# Altium footprint library PcbLibLafe.PcbLib: 297 footprints (part 7 of 19)
Each footprint in its own frame and in the unit in brackets; x right, y up, seen from the top. Pads: shape width x height; smd on the part's side, far side on the other; paste and mask are expansions set on the pad; w line width, h text height; cw(c..) or ccw(c..) is an arc to the next point about the centre after c.
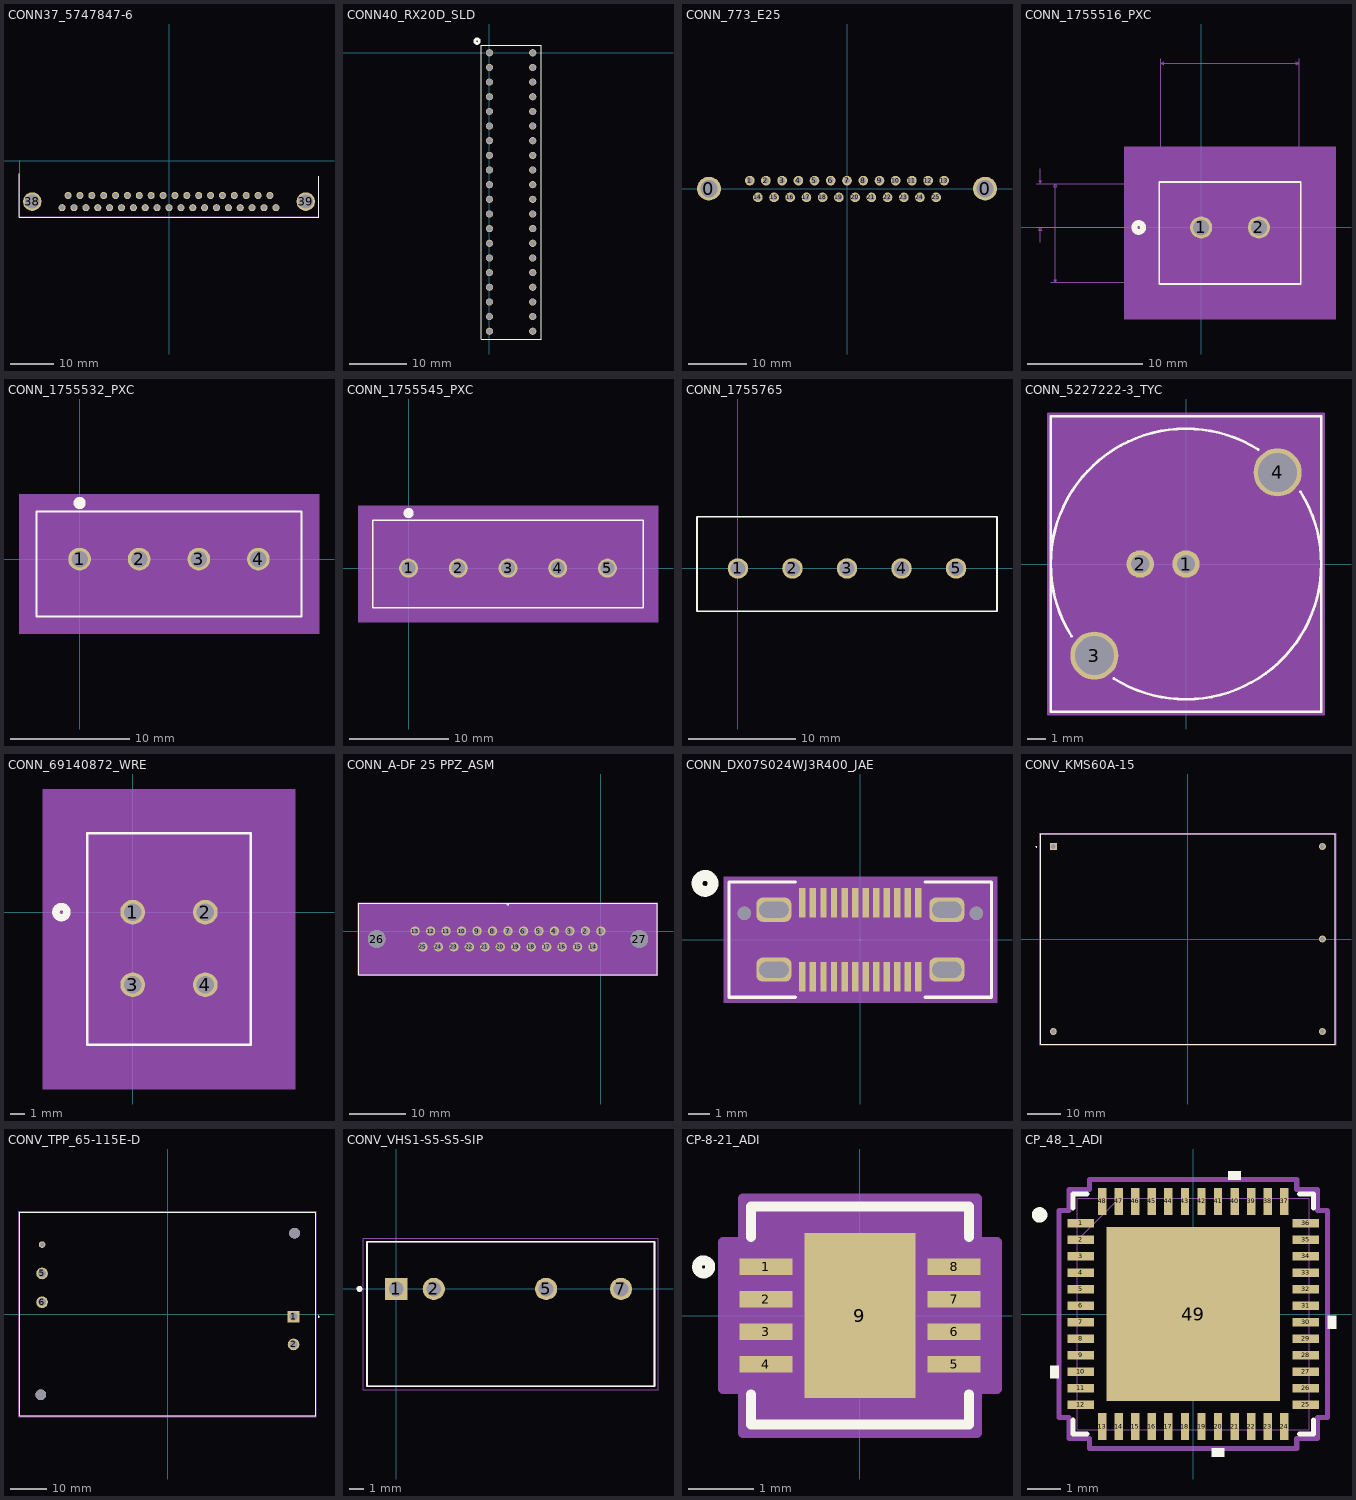
[diagram p6: the footprints below, top view; thin cyan lines are the x and y axes]

## CONN37_5747847-6 [mil] "male 37pin dsub"
pads (39):
  round 65 hole 45 mask+0: 1(-981,-430) 2(-872,-430) 3(-763,-430) 4(-654,-430) 5(-545,-430) 6(-436,-430) 7(-327,-430) 8(-218,-430) 9(-109,-430) 10(0,-430) 11(109,-430) 12(218,-430) 13(327,-430) 14(436,-430) 15(545,-430) 16(654,-430) 17(763,-430) 18(872,-430) 19(981,-430) 20(-926.5,-318) 21(-817.5,-318) 22(-708.5,-318) 23(-599.5,-318) 24(-490.5,-318) 25(-381.5,-318) 26(-272.5,-318) 27(-163.5,-318) 28(-54.5,-318) 29(54.5,-318) 30(163.5,-318) 31(272.5,-318) 32(381.5,-318) 33(490.5,-318) 34(599.5,-318) 35(708.5,-318) 36(817.5,-318) 37(926.5,-318)
  round 170 hole 130: 38(-1255,-374)
  round 170 / inner round 130 / far side round 130 hole 130: 39(1255,-374)
Top Overlay:
  lines w6: -1377,-118 -1377,-517 1377,-517 1377,-141
Mechanical 13:
  lines w1: -1372,0 -1372,-512 1372,-512
3D body: height 10, standoff 0, extent 0,0 10,10
3D body "CONN_5747847-6.step": height 509.02, standoff -125, extent -1362.01,-520 1382.01,235

## CONN40_RX20D_SLD [mil]
pads (40):
  round 49 hole 39 mask+0: 1(0,0) 2(0,-100) 3(0,-200) 4(0,-300) 5(0,-400) 6(0,-500) 7(0,-600) 8(0,-700) 9(0,-800) 10(0,-900) 11(0,-1000) 12(0,-1100) 13(0,-1200) 14(0,-1300) 15(0,-1400) 16(0,-1500) 17(0,-1600) 18(0,-1700) 19(0,-1800) 20(0,-1900) 21(295.28,-1900) 22(295.28,-1800) 23(295.28,-1700) 24(295.28,-1600) 25(295.28,-1500) 26(295.28,-1400) 27(295.28,-1300) 28(295.28,-1200) 29(295.28,-1100) 30(295.28,-1000) 31(295.28,-900) 32(295.28,-800) 33(295.28,-700) 34(295.28,-600) 35(295.28,-500) 36(295.28,-400) 37(295.28,-300) 38(295.28,-200) 39(295.28,-100) 40(295.28,0)
Top Overlay:
  circle w20: c-84.36,79 r15
  lines w6: -57.36,-1953 -57.36,53 352.64,53 352.64,-1953 -57.36,-1953
Bottom Overlay:
  circle w20: c-84.36,79 r15
3D body: height 10, standoff 0, extent 0,0 10,10

## CONN_773_E25 [mil] "25 pin maie right angle"
pads (27):
  round 160 hole 115: 0(-926,0) 0(926,0)
  round 65 hole 40: 1(-652,54) 2(-544,54) 3(-435,54) 4(-326,54) 5(-218,54) 6(-109,54) 7(0,54) 8(109,54) 9(218,54) 10(326,54) 11(435,54) 12(544,54) 13(652,54) 14(-598,-58) 15(-489,-58) 16(-381,-58) 17(-272,-58) 18(-163,-58) 19(-55,-58) 20(55,-58) 21(163,-58) 22(272,-58) 23(381,-58) 24(489,-58) 25(598,-58)
3D body "773-E25-113.STEP": height 496, standoff -124.5, extent -1043,-611.25 1044,67.25

## CONN_1755516_PXC [mil]
pads (2):
  round 75 hole 55 mask+0: 1(0,0) 2(196.85,0)
Top Overlay:
  circle w20: c-212.57,0 r15
  lines w6: -142.57,-192.39 339.43,-192.39 339.43,154.61 -142.57,154.61 -142.57,-192.39
Bottom Overlay:
  circle w20: c-212.57,0 r15
Mechanical 5:
  region: -262.57,274.61 459.43,274.61 459.43,-312.39 -262.57,-312.39
Mechanical 7:
  lines w1: -562.57,0 98.43,0 ; -562.57,149.61 -137.57,149.61 ; -547.57,-50 -547.57,0 ; -547.57,199.61 -547.57,149.61 ; -512.57,-187.39 -137.57,-187.39 ; -512.57,149.61 -137.57,149.61 ; -137.57,574.61 -137.57,149.61 ; 0,249.61 0,0 ; 196.85,0 196.85,249.61 ; 334.43,149.61 334.43,574.61 ; 434.43,-50 434.43,0 ; 434.43,50 434.43,0 ; -547.57,0 -552.57,-10 -542.57,-10 -547.57,0 ; -547.57,149.61 -552.57,159.61 -542.57,159.61 -547.57,149.61 ; -497.57,-187.39 -497.57,149.61 ; -497.57,-187.39 -502.57,-177.39 -492.57,-177.39 -497.57,-187.39 ; -497.57,149.61 -502.57,139.61 -492.57,139.61 -497.57,149.61 ; -137.57,559.61 334.43,559.61 ; -137.57,559.61 -127.57,564.61 -127.57,554.61 -137.57,559.61 ; 0,0 449.43,0 0,0 ; 0,234.61 196.85,234.61 ; 0,234.61 10,239.61 10,229.61 0,234.61 ; 196.85,234.61 186.85,239.61 186.85,229.61 196.85,234.61 ; 334.43,559.61 324.43,564.61 324.43,554.61 334.43,559.61 ; 434.43,0 429.43,10 439.43,10 434.43,0 ; 434.43,0 429.43,-10 439.43,-10 434.43,0
  text "Default Padstyle: EX75Y75D55P" at -264.07,-347.39 h50
  text "1st Mtg Padstyle: RX80Y120D50P" at -276.57,-422.39 h50
  text "2nd Mtg Padstyle: EX70Y70D70P" at -264.07,-497.39 h50
  text "3rd Mtg Padstyle: EX70Y70D70P" at -264.07,-572.39 h50
  text "Left Mtg Padstyle: EX60Y60D30P" at -276.57,-647.39 h50
  text "Right Mtg Padstyle: EX60Y60D30P" at -289.07,-722.39 h50
  text "Alt Padstyle 1: OX60Y90D30P" at -239.07,-797.39 h50
  text "Alt Padstyle 2: OX90Y60D30P" at -239.07,-872.39 h50
  text "0.197in/5mm" at -117.96,254.61 h25
  text "0.472in/11.989mm" at -1.57,579.61 h25
  text "0in/0mm" at 454.43,-12.5 h25
  text "0.15in/3.8mm" at -717.57,62.3 h25
  text "0.337in/8.56mm" at -692.57,-31.39 h25
Mechanical 13:
  circle w20: c0,75 r15
  lines w1: -137.57,-187.39 334.43,-187.39 334.43,149.61 -137.57,149.61 -137.57,-187.39
Mechanical 15:
  region: 344.43,159.61 -147.57,159.61 -147.57,-197.39 344.43,-197.39
  lines w6: -147.57,-197.39 -147.57,159.61 344.43,159.61 344.43,-197.39 -147.57,-197.39
3D body: height 10, standoff 0, extent 0,0 10,10

## CONN_1755532_PXC [mil]
pads (4):
  round 75 hole 55 mask+0: 1(0,0) 2(196.85,0) 3(393.7,0) 4(590.55,0)
Top Overlay:
  circle w20: c0,185.36 r10
  lines w6: -142.72,-189.64 -142.72,157.36 733.28,157.36 733.28,-189.64 -142.72,-189.64
Mechanical 5:
  region: 790.78,-247.14 -200.22,-247.14 -200.22,214.86 790.78,214.86
Mechanical 7:
  lines w1: 0,-244.64 0,-63.64 ; 50,-234.64 0,-234.64 ; 540.55,-234.64 590.55,-234.64 ; 590.55,-244.64 590.55,-63.64 ; 0,-234.64 10,-229.64 10,-239.64 0,-234.64 ; 590.55,-234.64 580.55,-229.64 580.55,-239.64 590.55,-234.64 ; 778.28,-16.14 783.28,-6.14 773.28,-6.14 778.28,-16.14 ; 778.28,-16.14 783.28,-26.14 773.28,-26.14 778.28,-16.14 ; 638.05,-16.14 788.28,-16.14 638.05,-16.14
  text ".5905512in/15mm (4 @ .1968504in/5mm)" at 70.28,-259.64 h25
  text "Alt 2 Padstyle: OX90Y60D30P" at -42.22,-684.64 h50
  text "Alt 1 Padstyle: OX60Y90D30P" at -42.22,-584.64 h50
  text "Pin 1 Padstyle: EX75Y75D55P" at -42.22,-484.64 h50
  text "Default Padstyle: OX75Y75D55P" at -67.22,-384.64 h50
Mechanical 13:
  circle w0: c0,137.36 r10
  lines w1: -137.72,-184.64 -137.72,152.36 728.28,152.36 728.28,-184.64 -137.72,-184.64
Mechanical 15:
  region: 738.28,162.36 -147.72,162.36 -147.72,-194.64 738.28,-194.64
  lines w6: -147.72,-194.64 738.28,-194.64 738.28,162.36 -147.72,162.36 -147.72,-194.64
3D body "1755532_04.stp": height 472.44, standoff -153.54, extent -116.14,-169.29 750,169.29
3D body: height 10, standoff 0, extent 0,0 10,10

## CONN_1755545_PXC [mil] "5 position 5mm pitch"
pads (5):
  round 75 hole 55 mask+0: 1(0,0) 2(196.85,0) 3(393.7,0) 4(590.55,0) 5(787.4,0)
Top Overlay:
  circle w20: c0,217.84 r10
  lines w6: -142.8,-157.16 -142.8,189.84 930.2,189.84 930.2,-157.16 -142.8,-157.16
Mechanical 5:
  region: 987.7,-214.66 -200.3,-214.66 -200.3,247.34 987.7,247.34
Mechanical 7:
  lines w1: -142.8,-172.9 -142.8,0 ; 0,-212.16 0,-31.16 ; 0,-172.9 0,0 ; 50,-202.16 0,-202.16 ; 737.4,-202.16 787.4,-202.16 ; 787.4,-212.16 787.4,-31.16 ; -142.8,-157.9 -132.8,-162.9 -132.8,-152.91 -142.8,-157.9 ; -142.8,-157.9 0,-157.9 ; 0,-202.16 10,-197.16 10,-207.16 0,-202.16 ; 0,-157.9 -10,-152.91 -10,-162.9 0,-157.9 ; 787.4,-202.16 777.4,-197.16 777.4,-207.16 787.4,-202.16 ; 975.2,16.34 980.2,26.34 970.2,26.34 975.2,16.34 ; 975.2,16.34 980.2,6.34 970.2,6.34 975.2,16.34 ; 834.9,16.34 985.2,16.34 834.9,16.34
  text "0.143in/3.627mm" at -165.15,-202.9 h25
  text ".7874016in/20mm (5 @ .1968504in/5mm)" at 168.7,-227.16 h25
  text "Alt 2 Padstyle: OX90Y60D30P" at 56.2,-652.16 h50
  text "Alt 1 Padstyle: OX60Y90D30P" at 56.2,-552.16 h50
  text "Pin 1 Padstyle: EX75Y75D55P" at 56.2,-452.16 h50
  text "Default Padstyle: OX75Y75D55P" at 31.2,-352.16 h50
Mechanical 13:
  circle w0: c0,169.84 r10
  lines w1: -137.8,-152.16 -137.8,184.84 925.2,184.84 925.2,-152.16 -137.8,-152.16
Mechanical 15:
  region: 935.2,194.84 -147.8,194.84 -147.8,-162.16 935.2,-162.16
  lines w6: -147.8,-162.16 935.2,-162.16 935.2,194.84 -147.8,194.84 -147.8,-162.16
3D body "1755545_04.stp": height 472.44, standoff -153.54, extent -112.99,-169.29 950,169.29
3D body: height 10, standoff 0, extent 0,0 10,10

## CONN_1755765 [mil] "5 position 200 mil"
pads (5):
  round 75 hole 55 mask+0: 1(0,0) 2(200,0) 3(400,0) 4(600,0) 5(800,0)
Top Overlay:
  lines w6: -150,-157.16 -150,189.84 950,189.84 950,-157.16 -150,-157.16
3D body: height 10, standoff 0, extent 0,0 10,10

## CONN_5227222-3_TYC [mil]
pads (4):
  round 60 hole 40 paste-99999 mask+0: 1(0,0) 2(-100,0)
  round 105 / inner round 60 / far side round 105 hole 85 paste-99999 mask+0: 3(-200,-200) 4(200,200)
Top Overlay:
  lines w6: -250,-157.54 cw(c0,0) 157.54,250 ; -157.54,-250 ccw(c0,0) 295.5,0 ccw(c0,0) 250,157.54 ; -295.5,-322.5 295.5,-322.5 295.5,322.5 -295.5,322.5 -295.5,-322.5
Mechanical 13:
  circle w0: c0,0 r290.5
  lines w1: -290.5,-317.5 290.5,-317.5 290.5,317.5 -290.5,317.5 -290.5,-317.5
Mechanical 15:
  region: 300.5,-327.5 -300.5,-327.5 -300.5,327.5 300.5,327.5
  lines w6: -300.5,-327.5 300.5,-327.5 300.5,327.5 -300.5,327.5 -300.5,-327.5
3D body "c-5227222-3-c-3d.stp": height 1400, standoff -225, extent -300.5,-293 280.5,332

## CONN_69140872_WRE [mil]
pads (4):
  round 67 hole 47 mask+0: 1(0,0) 2(196.85,0) 3(0,-196.85) 4(196.85,-196.85)
Top Overlay:
  circle w20: c-193.07,0 r15
  lines w6: -123.07,-359.33 319.93,-359.33 319.93,213.67 -123.07,213.67 -123.07,-359.33
Bottom Overlay:
  circle w20: c-193.07,0 r15
Mechanical 5:
  region: -243.07,333.67 439.93,333.67 439.93,-479.33 -243.07,-479.33
Mechanical 13:
  circle w20: c0,75 r15
  lines w1: -118.07,-354.33 314.93,-354.33 314.93,208.67 -118.07,208.67 -118.07,-354.33
Mechanical 15:
  region: 324.93,218.67 -128.07,218.67 -128.07,-364.33 324.93,-364.33
  lines w6: -128.07,-364.33 -128.07,218.67 324.93,218.67 324.93,-364.33 -128.07,-364.33
3D body "Download_STP_691408720002B_rev1.stp": height 531.5, standoff -159.52, extent -130.16,-351.18 350.16,200
3D body: height 10, standoff 0, extent 0,0 10,10

## CONN_A-DF 25 PPZ_ASM [mil]
pads (27):
  round 65 / inner round 60 / far side round 65 hole 45 paste-99999 mask+0: 1(0,0) 2(-109.06,0) 3(-218.11,0) 4(-327.17,0) 5(-436.22,0) 6(-545.28,0) 7(-654.33,0) 8(-763.39,0) 9(-872.44,0) 10(-981.5,0) 11(-1090.55,0) 12(-1199.61,0) 13(-1308.66,0) 14(-54.53,-111.81) 15(-163.58,-111.81) 16(-272.64,-111.81) 17(-381.69,-111.81) 18(-490.75,-111.81) 19(-599.8,-111.81) 20(-708.86,-111.81) 21(-817.91,-111.81) 22(-926.97,-111.81) 23(-1036.02,-111.81) 24(-1145.08,-111.81) 25(-1254.13,-111.81)
  round 124 / inner round 60 / far side round 124 hole 124 unplated paste-99999 mask-62: 26(-1580.32,-55.91) 27(271.65,-55.91)
Top Overlay:
  lines w6: -1706.33,-307.86 -1706.33,196.14 397.67,196.14 397.67,-307.86 -1706.33,-307.86 ; -659.33,186.14 -659.33,196.14 -649.33,196.14 -649.33,186.14 -659.33,186.14
  text "*" at -112.5,-25 h50
Mechanical 13:
  lines w1: -1701.33,-302.86 -1701.33,191.14 392.67,191.14 392.67,-302.86 -1701.33,-302.86
  text "*" at -112.5,-25 h50
Mechanical 15:
  region: 402.67,-312.86 402.67,201.14 -1711.33,201.14 -1711.33,-312.86
  lines w6: -1711.33,-312.86 402.67,-312.86 402.67,201.14 -1711.33,201.14 -1711.33,-312.86
3D body "connector_a-df_25_pp_z.stp": height 478.35, standoff -179.13, extent -1699.09,-302.05 389.09,192.05

## CONN_DX07S024WJ3R400_JAE [mil]
pads (30):
  rect 12x55 smd paste+0 mask+0: A1(-108.27,68.9) A2(-88.58,68.9) A3(-68.9,68.9) A4(-49.21,68.9) A5(-29.53,68.9) A6(-9.84,68.9) A7(9.84,68.9) A8(29.53,68.9) A9(49.21,68.9) A10(68.9,68.9) A11(88.58,68.9) A12(108.27,68.9) B1(108.27,-68.9) B2(88.58,-68.9) B3(68.9,-68.9) B4(49.21,-68.9) B5(29.53,-68.9) B6(9.84,-68.9) B7(-9.84,-68.9) B8(-29.53,-68.9) B9(-49.21,-68.9) B10(-68.9,-68.9) B11(-88.58,-68.9) B12(-108.27,-68.9)
  round 25 hole 25 unplated: ""(-216.54,49.21) ""(216.54,49.21)
  rrect50% 65x45 hole 30 slot 55 at 0 deg: ""(-161.42,-55.91) ""(-161.42,55.91) ""(161.42,-55.91) ""(161.42,55.91)
Top Overlay:
  circle w20: c-290,105 r15
  lines w6: -121.22,-107.5 -245,-107.5 -245,107.5 -121.22,107.5 ; 121.22,-107.5 245,-107.5 245,107.5 121.22,107.5
Bottom Overlay:
  circle w20: c-290,105 r15
Mechanical 5:
  region: 255,-117.5 255,117.5 -255,117.5 -255,-117.5
Mechanical 13:
  lines w1: -240,-102.5 240,-102.5 240,102.5 -240,102.5 -240,-102.5
Mechanical 15:
  region: 250,-112.5 250,112.5 -250,112.5 -250,-112.5
  lines w6: -250,-112.5 250,-112.5 250,112.5 -250,112.5 -250,-112.5

## CONV_KMS60A-15 [mm]
pads (5):
  rect 2.1x2.1 hole 1.4: 1(-40.65,27.94)
  round 2.1 hole 1.4: 2(-40.65,-27.94) 3(40.65,27.94) 5(40.65,0) 7(40.65,-27.94)
Top Overlay:
  circle w0.2: c-45.775,27.845 r0.1
  lines w0.127: -44.5,-31.75 44.5,-31.75 44.5,31.75 -44.5,31.75 -44.5,-31.75
Mechanical 13:
  circle w0.2: c-45.775,27.845 r0.1
  lines w0.127: -44.5,-31.75 44.5,-31.75 44.5,31.75 -44.5,31.75 -44.5,-31.75
Mechanical 15:
  lines w0.05: -44.75,-32 44.75,-32 44.75,32 -44.75,32 -44.75,-32
3D body "step_temp.STEP": height 27, standoff -6, extent -44.5,-31.75 44.5,31.75

## CONV_TPP_65-115E-D [mm]
pads (7):
  rect 3.216x3.216 hole 2.2: 1(34.62,-0.75)
  round 3.216 hole 2.2: 2(34.62,-8.37) 5(-34.55,11.16) 6(-34.55,3.24)
  round 1.8 hole 1.2: 4(-34.55,19.09)
  round 2.95 hole 2.95 unplated: ""(-34.9,-22.22) ""(34.9,22.23)
Top Overlay:
  circle w0.2: c41.51,-0.75 r0.1
  lines w0.127: -40.65,-27.95 40.65,-27.95 40.65,27.95 -40.65,27.95 -40.65,-27.95
Mechanical 13:
  circle w0.2: c41.51,-0.75 r0.1
  lines w0.127: -40.65,-27.95 40.65,-27.95 40.65,27.95 -40.65,27.95 -40.65,-27.95
Mechanical 15:
  lines w0.05: -40.9,-28.2 40.9,-28.2 40.9,28.2 -40.9,28.2 -40.9,-28.2
3D body "step_temp.STEP": height 30.48, standoff -3.8, extent -40.65,-27.95 40.65,27.95

## CONV_VHS1-S5-S5-SIP [mm]
pads (4):
  rect 1.508x1.508 hole 1: 1(0,0)
  round 1.508 hole 1: 2(2.54,0) 5(10.16,0) 7(15.24,0)
Top Overlay:
  circle w0.2: c-2.5,0 r0.1
  lines w0.127: -2,-6.6 -2,3.2 17.5,3.2 17.5,-6.6 -2,-6.6
Mechanical 13:
  circle w0.2: c-2.5,0 r0.1
  lines w0.127: -2,-6.6 17.5,-6.6 17.5,3.2 -2,3.2 -2,-6.6
Mechanical 15:
  lines w0.05: -2.25,-6.85 17.75,-6.85 17.75,3.45 -2.25,3.45 -2.25,-6.85

## CP-8-21_ADI [mil]
pads (9):
  rect 32x10 smd paste+0 mask+0: 1(-57,29.53) 2(-57,9.84) 3(-57,-9.84) 4(-57,-29.53) 5(57,-29.53) 6(57,-9.84) 7(57,9.84) 8(57,29.53)
  rect 67x100 smd paste+0 mask+0: 9(0,0)
Top Overlay:
  circle w6: c-94.69,29.53 r4
  lines w6: -66,-47.63 -66,-66 66,-66 66,-47.63 ; -66,47.63 -66,66 66,66 66,47.63
Top Paste:
  region: 29.56,-3.94 -29.56,-3.94 -29.56,-46.06 29.56,-46.06
  region: 29.56,46.06 -29.56,46.06 -29.56,3.94 29.56,3.94
Mechanical 13:
  circle w0: c-41,29.53 r3
  lines w0: -12,61 ccw(c0,61) 12,61
  lines w1: -61,-61 -61,61 61,61 61,-61 -61,-61
Mechanical 15:
  region: -71,-44.53 -83,-44.53 -83,44.53 -71,44.53 -71,71 71,71 71,44.53 83,44.53 83,-44.53 71,-44.53 71,-71 -71,-71
  lines w6: -83,-44.53 -71,-44.53 -71,-71 71,-71 71,-44.53 83,-44.53 83,44.53 71,44.53 71,71 -71,71 -71,44.53 -83,44.53 -83,-44.53
3D body "CP-8-21_ADI.step": height 32.09, standoff 0, extent -60.98,-60.98 60.98,60.98

## CP_48_1_ADI [mil]
pads (49):
  rect 32x10 smd paste+0 mask+0: 1(-134,108.27) 2(-134,88.58) 3(-134,68.9) 4(-134,49.21) 5(-134,29.53) 6(-134,9.84) 7(-134,-9.84) 8(-134,-29.53) 9(-134,-49.21) 10(-134,-68.9) 11(-134,-88.58) 12(-134,-108.27) 25(134,-108.27) 26(134,-88.58) 27(134,-68.9) 28(134,-49.21) 29(134,-29.53) 30(134,-9.84) 31(134,9.84) 32(134,29.53) 33(134,49.21) 34(134,68.9) 35(134,88.58) 36(134,108.27)
  rect 10x32 smd paste+0 mask+0: 13(-108.27,-134) 14(-88.58,-134) 15(-68.9,-134) 16(-49.21,-134) 17(-29.53,-134) 18(-9.84,-134) 19(9.84,-134) 20(29.53,-134) 21(49.21,-134) 22(68.9,-134) 23(88.58,-134) 24(108.27,-134) 37(108.27,134) 38(88.58,134) 39(68.9,134) 40(49.21,134) 41(29.53,134) 42(9.84,134) 43(-9.84,134) 44(-29.53,134) 45(-49.21,134) 46(-68.9,134) 47(-88.58,134) 48(-108.27,134)
  rect 207x207 smd paste-103 mask+0: 49(0,0)
Top Overlay:
  circle w10: c-183,118 r4.24
  region: -160,-61.4 -170,-61.4 -170,-76.4 -160,-76.4
  region: 37.03,-160 22.03,-160 22.03,-170 37.03,-170
  region: 160,-2.34 170,-2.34 170,-17.34 160,-17.34
  region: 56.71,160 41.71,160 41.71,170 56.71,170
  lines w6: -143,-126.37 -143,-143 -126.37,-143 ; -143,126.37 -143,143 -126.37,143 ; 126.37,-143 143,-143 143,-126.37 ; 126.37,143 143,143 143,126.37
Top Paste:
  region: -55.69,99.56 -99.56,99.56 -99.56,55.69 -55.69,55.69
  region: -55.69,47.81 -99.56,47.81 -99.56,3.94 -55.69,3.94
  region: -55.69,-3.94 -99.56,-3.94 -99.56,-47.81 -55.69,-47.81
  region: -55.69,-55.69 -99.56,-55.69 -99.56,-99.56 -55.69,-99.56
  region: -3.94,99.56 -47.81,99.56 -47.81,55.69 -3.94,55.69
  region: -3.94,47.81 -47.81,47.81 -47.81,3.94 -3.94,3.94
  region: -3.94,-3.94 -47.81,-3.94 -47.81,-47.81 -3.94,-47.81
  region: -3.94,-55.69 -47.81,-55.69 -47.81,-99.56 -3.94,-99.56
  region: 47.81,99.56 3.94,99.56 3.94,55.69 47.81,55.69
  region: 47.81,47.81 3.94,47.81 3.94,3.94 47.81,3.94
  region: 47.81,-3.94 3.94,-3.94 3.94,-47.81 47.81,-47.81
  region: 47.81,-55.69 3.94,-55.69 3.94,-99.56 47.81,-99.56
  region: 99.56,99.56 55.69,99.56 55.69,55.69 99.56,55.69
  region: 99.56,47.81 55.69,47.81 55.69,3.94 99.56,3.94
  region: 99.56,-3.94 55.69,-3.94 55.69,-47.81 99.56,-47.81
  region: 99.56,-55.69 55.69,-55.69 55.69,-99.56 99.56,-99.56
Mechanical 13:
  lines w1: -138,88 -88,138 ; -138,-138 138,-138 138,138 -138,138 -138,-138 ; -138,-114.27 -138,-102.27 -138,-114.27 ; -138,-94.58 -138,-82.58 -138,-94.58 ; -138,-74.9 -138,-62.9 -138,-74.9 ; -138,-55.21 -138,-43.21 -138,-55.21 ; -138,-35.53 -138,-23.53 -138,-35.53 ; -138,-15.84 -138,-3.84 -138,-15.84 ; -138,3.84 -138,15.84 -138,3.84 ; -138,23.53 -138,35.53 -138,23.53 ; -138,43.21 -138,55.21 -138,43.21 ; -138,62.9 -138,74.9 -138,62.9 ; -138,82.58 -138,94.58 -138,82.58 ; -138,102.27 -138,114.27 -138,102.27 ; -114.27,-138 -102.27,-138 -114.27,-138 ; -114.27,138 -102.27,138 -114.27,138 ; -94.58,-138 -82.58,-138 -94.58,-138 ; -94.58,138 -82.58,138 -94.58,138 ; -74.9,-138 -62.9,-138 -74.9,-138 ; -74.9,138 -62.9,138 -74.9,138 ; -55.21,-138 -43.21,-138 -55.21,-138 ; -55.21,138 -43.21,138 -55.21,138 ; -35.53,-138 -23.53,-138 -35.53,-138 ; -35.53,138 -23.53,138 -35.53,138 ; -15.84,-138 -3.84,-138 -15.84,-138 ; -15.84,138 -3.84,138 -15.84,138 ; 3.84,-138 15.84,-138 3.84,-138 ; 3.84,138 15.84,138 3.84,138 ; 23.53,-138 35.53,-138 23.53,-138 ; 23.53,138 35.53,138 23.53,138 ; 43.21,-138 55.21,-138 43.21,-138 ; 43.21,138 55.21,138 43.21,138 ; 62.9,-138 74.9,-138 62.9,-138 ; 62.9,138 74.9,138 62.9,138 ; 82.58,-138 94.58,-138 82.58,-138 ; 82.58,138 94.58,138 82.58,138 ; 102.27,-138 114.27,-138 102.27,-138 ; 102.27,138 114.27,138 102.27,138 ; 138,-114.27 138,-102.27 138,-114.27 ; 138,-94.58 138,-82.58 138,-94.58 ; 138,-74.9 138,-62.9 138,-74.9 ; 138,-55.21 138,-43.21 138,-55.21 ; 138,-35.53 138,-23.53 138,-35.53 ; 138,-15.84 138,-3.84 138,-15.84 ; 138,3.84 138,15.84 138,3.84 ; 138,23.53 138,35.53 138,23.53 ; 138,43.21 138,55.21 138,43.21 ; 138,62.9 138,74.9 138,62.9 ; 138,82.58 138,94.58 138,82.58 ; 138,102.27 138,114.27 138,102.27
  text "*" at -130.5,93.11 h50
Mechanical 15:
  lines w6: -160,-123.27 -148,-123.27 -148,-148 -123.27,-148 -123.27,-160 123.27,-160 123.27,-148 148,-148 148,-123.27 160,-123.27 160,123.27 148,123.27 148,148 123.27,148 123.27,160 -123.27,160 -123.27,148 -148,148 -148,123.27 -160,123.27 -160,-123.27
3D body: height 10, standoff 0, extent 0,0 10,10
3D body "CP_48_1_ADI.step": height 39.09, standoff 0, extent -137.99,-137.99 138,138